# Altium footprint library Miscellaneous.PcbLib: 139 footprints (part 9 of 9)
Each footprint in its own frame and in the unit in brackets; x right, y up, seen from the top. Pads: shape width x height; smd on the part's side, far side on the other; paste and mask are expansions set on the pad; w line width, h text height; cw(c..) or ccw(c..) is an arc to the next point about the centre after c.
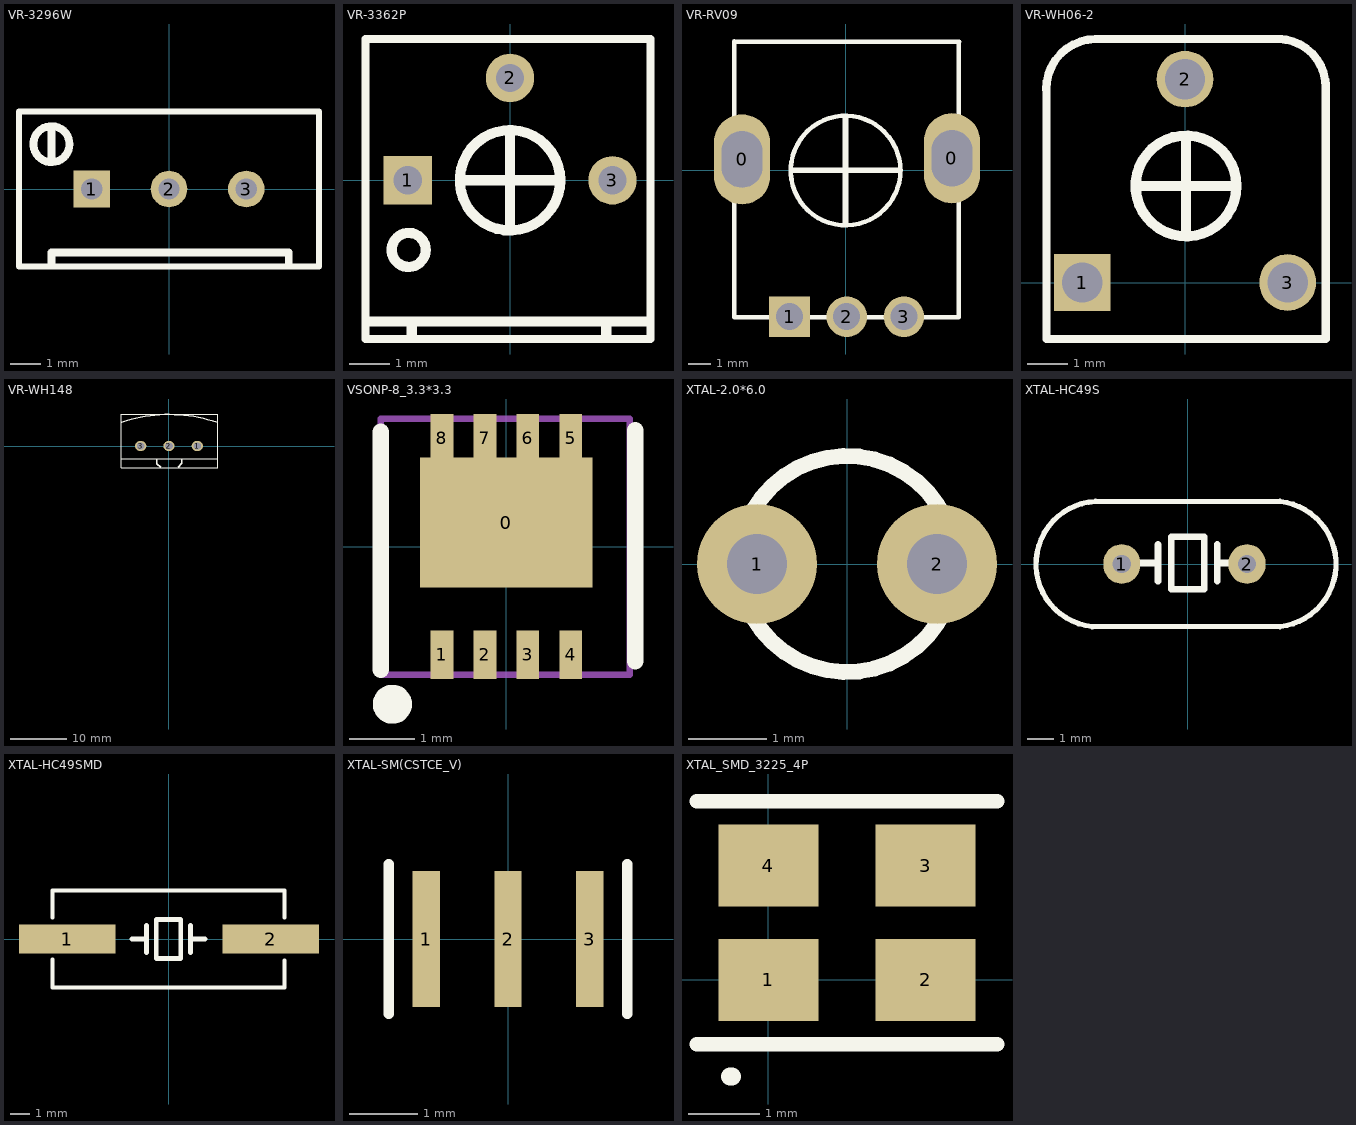
[diagram p8: the footprints below, top view; thin cyan lines are the x and y axes]

## VR-3296W [mm] "Thru-Hole; 3 Leads"
pads (3):
  rect 1.2x1.2 hole 0.7: 1(-2.54,0)
  round 1.2 hole 0.7: 2(0,0) 3(2.54,0)
Top Overlay:
  circle w0.254: c-3.861,1.473 r0.593
  lines w0.2: -4.928,-2.54 -4.928,2.54 4.928,2.54 4.928,0.152 4.928,-2.54 -4.928,-2.54
  lines w0.254: -3.861,-2.489 -3.861,-2.083 3.937,-2.083 3.937,-2.464 ; -3.861,0.94 -3.861,2.057
3D body "User Library-bourns 3296 pot.step": height 11.55, standoff -6.4, extent -4.765,-2.437 4.765,2.394

## VR-3362P [mm] "Thru-Hole; 3 Leads"
pads (3):
  rect 1.2x1.2 hole 0.7: 1(-2.54,0)
  round 1.2 hole 0.7: 2(0,2.54) 3(2.54,0)
Top Overlay:
  circle w0.254: c0,0 r1.246
  circle w0.254: c-2.515,-1.727 r0.423
  lines w0.2: -3.581,-3.937 -3.581,3.505 3.48,3.505 3.48,0.432 3.48,-3.937 -3.581,-3.937
  lines w0.254: -3.531,-3.505 3.454,-3.505 ; -2.438,-3.873 -2.438,-3.543 ; -1.245,0 1.246,0 ; -0.025,1.245 0,1.219 0,-1.245 ; 2.388,-3.861 2.388,-3.505
3D body "User Library-Bourns 3362P.step": height 4.7, standoff -5.47, extent -3.351,-3.754 3.249,3.3

## VR-RV09 [mm] "Thru-Hole; 3 Leads"
pads (5):
  oval 2.5x4 hole 1.8 slot 2.5 at 90 deg: 0(-4.61,0.483) 0(4.712,0.533)
  rect 1.8x1.8 hole 1.2: 1(-2.502,-6.502)
  round 1.8 hole 1.2: 2(0.038,-6.502) 3(2.578,-6.502)
Top Overlay:
  circle w0.203: c-0.013,-0.013 r2.434
  lines w0.2: -4.966,-6.528 5.016,-6.528 5.016,5.715 ; -4.966,-6.502 -4.966,5.74 ; -4.966,5.715 5.042,5.715
  lines w0.254: -2.4,0 2.4,0 ; -0.013,-2.388 -0.013,2.362
3D body "User Library-RV09ACF-40_RK09K1130A5R.step": height 19.9, standoff -3.9, extent -4.863,-6.727 4.889,5.823

## VR-WH06-2 [mm] "Thru-Hole; 3 Leads"
pads (3):
  rect 1.4x1.4 hole 1: 1(-2.54,0)
  round 1.4 hole 1: 2(0,5.029) 3(2.54,0)
Top Overlay:
  circle w0.254: c0.025,2.388 r1.246
  lines w0.2: -3.429,4.775 -3.429,-1.397 3.48,-1.397 3.48,0.432 3.48,4.928 ; -2.184,6.02 2.388,6.02
  lines w0.203: -3.431,4.775 cw(c-2.197,4.788) -2.21,6.021 ; 2.311,6.02 cw(c2.299,4.839) 3.48,4.826
  lines w0.254: -1.219,2.388 1.271,2.388 ; 0.025,1.143 0.025,3.607
3D body "User Library-Pot - RES_VAR1.step": height 8.1, standoff -2.8, extent -3.2,-1.214 3.3,5.836

## VR-WH148 [mm]
pads (3):
  oval 2x1.8 hole 1.1 slot 1.3 at 0 deg: 1(5.029,0) 2(0,0) 3(-5.029,0)
Top Overlay:
  lines w0.203: -8.484,-2.235 8.636,-2.235 ; -8.509,-3.835 -2.261,-3.835 3.632,-3.835 8.636,-3.835 8.636,2.591 8.636,5.69 -8.509,5.69 -8.509,2.464 -8.509,-3.835
  lines w0.254: -8.395,4.254 cw(c0.003,-20.996) 8.54,4.207 ; -2.159,-2.261 -2.159,-3.124 -1.486,-3.797 ; 1.626,-3.759 2.311,-3.073 2.311,-2.286
3D body "User Library-User Library-Potentiometer.step": height 21.08, standoff -3.86, extent -8.331,-18.669 8.433,5.461

## VSONP-8_3.3*3.3 [mm]
pads (9):
  rect 2.65x2 smd: 0(0,0.368)
  rect 0.35x0.75 smd: 1(-0.991,-1.664) 2(-0.33,-1.664) 3(0.33,-1.664) 4(0.991,-1.664) 5(0.991,1.664) 6(0.33,1.664) 7(-0.33,1.664) 8(-0.991,1.664)
Top Overlay:
  circle w0.3: c-1.753,-2.426 r0.15
  lines w0.254: -1.93,-1.892 -1.93,1.765 ; 1.981,-1.765 1.981,1.791
Mechanical 13:
  lines w0.1: -1.93,-1.968 1.9,-1.968 1.9,1.968 -1.93,1.968 -1.93,-1.968
3D body "User Library-8-VSONP3x3.step": height 0.9, standoff 0, extent -1.9,-1.878 1.9,1.892

## XTAL-2.0*6.0 [mil]
pads (2):
  round 60 hole 30: 1(-45,0) 2(45,0)
Top Overlay:
  circle w7.87: c0.05,0 r54.05
3D body "User Library-KX-26.step": height 76.77, standoff -78.74, extent -45.28,-10.7 45.28,318.04

## XTAL-HC49S [mil]
pads (2):
  oval 56x60 hole 28: 1(-100,0) 2(90,0)
Top Overlay:
  lines w7.87: -144.76,-95 140,-95 ; -140,95 140,95
  lines w8: -144.76,-95 cw(c-134.81,-0.19) -140,95 ; 140,-95 ccw(c129.41,0) 140,95
  lines w10: -74.8,1.57 -45,1.57 ; -45,-26.43 -45,29.57 ; 45,-26.43 45,29.57 ; 45,1.57 74.8,1.57 ; -25,-38.43 25,-38.43 25,41.57 -25,41.57 -25,-38.43
3D body "User Library-HC49S-1.STEP": height 141.73, standoff -118.11, extent -220.08,-88.4 212.21,88.41

## XTAL-HC49SMD [mm]
pads (2):
  rect 5x1.5 smd: 1(-5.232,0) 2(5.283,0)
Top Overlay:
  lines w0.203: -6,-2.5 -6,-1.05 ; -6,1.1 -6,2.5 6,2.5 6,1.6 ; -5.95,-2.5 6,-2.5 6,-1.1 ; 6,1.1 6,1.62
  lines w0.254: -1.9,0 -1.143,0 ; -1.143,-0.711 -1.143,0.711 ; 1.143,-0.711 1.143,0.711 ; 1.143,0 1.9,0 ; -0.635,-1.016 0.635,-1.016 0.635,1.016 -0.635,1.016 -0.635,-1.016
3D body "XTAL-SM.STEP": height 4.05, standoff 0.02, extent -5.75,-2.45 5.75,2.35

## XTAL-SM(CSTCE_V) [mm] "muRata's resonator use in UP-RobotServo"
pads (3):
  rect 0.4x2 smd: 1(-1.2,0) 2(0,0) 3(1.2,0)
Top Overlay:
  lines w0.152: -1.75,-1.1 -1.75,1.1 ; 1.75,-1.1 1.75,1.1
3D body "XTAL-SM(CSTCE_V).STEP": height 0.7, standoff 0, extent -1.6,-0.6 1.6,0.7

## XTAL_SMD_3225_4P [mm]
pads (4):
  rect 1.4x1.15 smd: 1(0,0) 2(2.2,0) 3(2.2,1.6) 4(0,1.6)
Top Overlay:
  lines w0.203: -1,-0.9 3.2,-0.9 ; -1,2.5 3.2,2.5
  lines w0.254: -0.534,-1.355 -0.509,-1.355
3D body "User Library-3225-1.STEP": height 0.61, standoff 0, extent -0.5,-0.45 2.7,2.05